# Altium footprint library ICs And Semiconductors SMD.PcbLib: 943 footprints (part 40 of 60)
Each footprint in its own frame and in the unit in brackets; x right, y up, seen from the top. Pads: shape width x height; smd on the part's side, far side on the other; paste and mask are expansions set on the pad; w line width, h text height; cw(c..) or ccw(c..) is an arc to the next point about the centre after c.
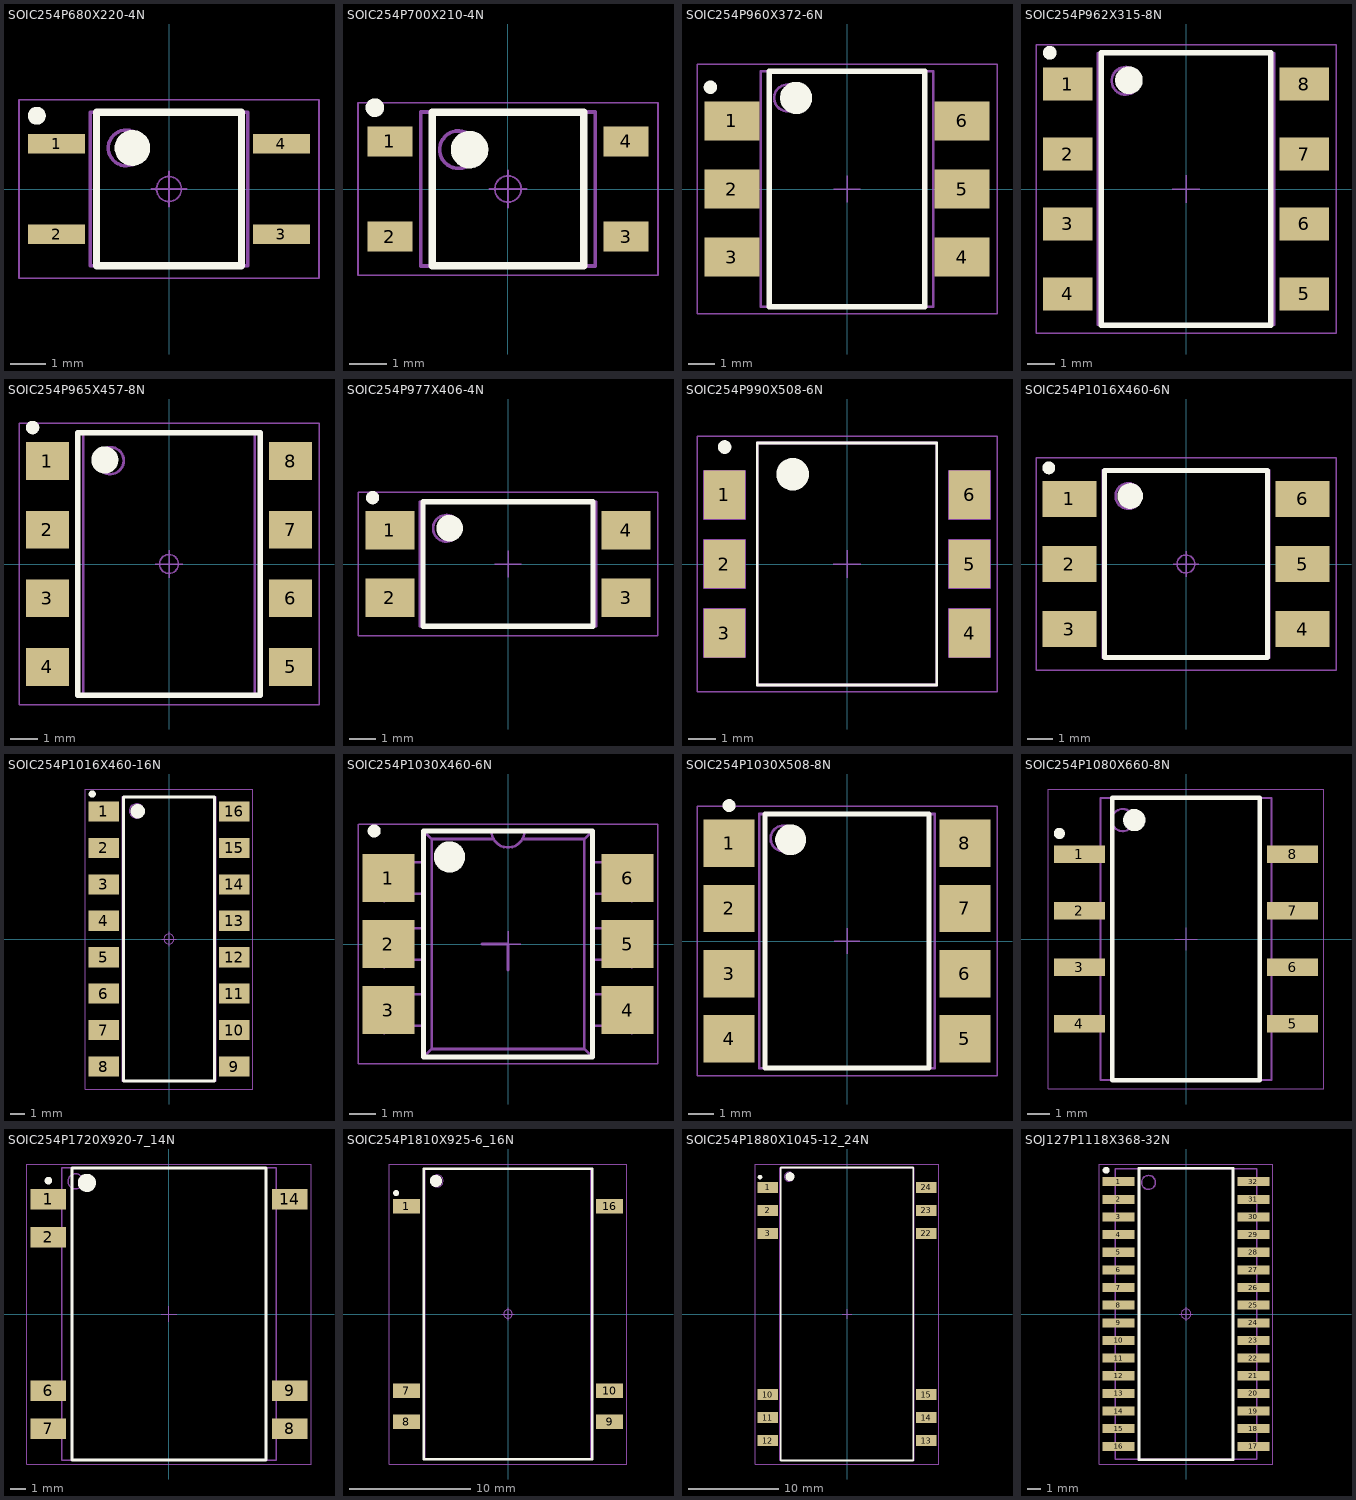
[diagram p39: the footprints below, top view; thin cyan lines are the x and y axes]

## SOIC254P680X220-4N [mm] "SOIC,2.54mm,pitch;4 pin,4.40mm W X 4.30mm L X 2.20mm H body, IPC Medium Density"
height 2.2
pads (4):
  rect 1.6x0.55 smd: 1(-3.15,1.27) 2(-3.15,-1.27) 3(3.15,-1.27) 4(3.15,1.27)
Top Overlay:
  circle w0.25: c-3.7,2.05 r0.125
  circle w0.5: c-1.025,1.15 r0.25
  lines w0.2: -2.025,-2.15 -2.025,2.15 2.025,2.15 2.025,-2.15 -2.025,-2.15
Mechanical 14:
  circle w0.1: c-1.2,1.15 r0.5
  lines w0.1: -2.2,-2.15 -2.2,2.15 2.2,2.15 2.2,-2.15 -2.2,-2.15
Mechanical 15:
  circle w0.05: c0,0 r0.35
  lines w0.05: -0.5,0 0.5,0 ; 0,-0.5 0,0.5 ; -4.2,-2.5 -4.2,2.5 4.2,2.5 4.2,-2.5 -4.2,-2.5
3D body "SOIC254P680X220-4N.stp": height 2.2, standoff 0, extent -3.6,-2.15 3.6,2.15

## SOIC254P700X210-4N [mm] "SOIC,2.54mm,pitch;4 pin,4.40mm W X 3.90mm L X 2.10mm H body, IPC Medium Density"
height 2.1
pads (4):
  rect 1.2x0.8 smd: 1(-3.15,1.27) 2(-3.15,-1.27) 3(3.15,-1.27) 4(3.15,1.27)
Top Overlay:
  circle w0.25: c-3.55,2.17 r0.125
  circle w0.5: c-1.025,1.05 r0.25
  lines w0.2: -2.025,-2.05 -2.025,2.05 2.025,2.05 2.025,-2.05 -2.025,-2.05
Mechanical 14:
  circle w0.1: c-1.325,1.05 r0.5
  lines w0.1: -2.325,-2.05 2.325,-2.05 2.325,2.05 -2.325,2.05 -2.325,-2.05
Mechanical 15:
  circle w0.05: c0,0 r0.35
  lines w0.05: -4,-2.3 -4,2.3 4,2.3 4,-2.3 -3.975,-2.3 ; -0.5,0 0.5,0 ; 0,-0.5 0,0.5
3D body "SOIC254P700X210-4N.stp": height 2.1, standoff 0, extent -3.7,-2.05 3.7,2.05

## SOIC254P960X372-6N [mm] "SOIC,2.54mm pitch;6 pin,6.44mm W X 8.80mm L, IPC Medium Density"
height 3.72
pads (6):
  rect 2.05x1.45 smd: 1(-4.3,2.54) 2(-4.3,0) 3(-4.3,-2.54) 4(4.3,-2.54) 5(4.3,0) 6(4.3,2.54)
Top Overlay:
  circle w0.6: c-1.9,3.4 r0.3
  circle w0.25: c-5.1,3.8 r0.125
  lines w0.2: -2.9,-4.4 -2.9,4.4 2.9,4.4 2.9,-4.4 -2.9,-4.4
Mechanical 14:
  circle w0.1: c-2.22,3.4 r0.5
  lines w0.1: -3.22,-4.4 -3.22,4.4 3.22,4.4 3.22,-4.4 -3.22,-4.4
Mechanical 15:
  lines w0.05: -0.5,0 0.5,0 ; 0,-0.5 0,0.5 ; -5.6,-4.65 -5.6,4.65 5.6,4.65 5.6,-4.65 -5.6,-4.65
3D body "SOIC254P960X372-6N.stp": height 3.6, standoff 0, extent -4.842,-4.425 4.842,4.425

## SOIC254P962X315-8N [mm] "DIP Gull Wing Surface Mount, 8-Leads, Body 9.86x6.4mm (nom), Pitch 2.54mm, IPC Medium Density"
height 3.15
pads (8):
  rect 1.8x1.2 smd: 1(-4.3,3.81) 2(-4.3,1.27) 3(-4.3,-1.27) 4(-4.3,-3.81) 5(4.3,-3.81) 6(4.3,-1.27) 7(4.3,1.27) 8(4.3,3.81)
Top Overlay:
  circle w0.25: c-4.95,4.95 r0.125
  circle w0.5: c-2.075,3.95 r0.25
  lines w0.2: -3.075,-4.95 -3.075,4.95 3.075,4.95 3.075,-4.95 -3.075,-4.95
Mechanical 14:
  circle w0.1: c-2.2,3.93 r0.5
  lines w0.1: -3.2,-4.93 3.2,-4.93 3.2,4.93 -3.2,4.93 -3.2,-4.93
Mechanical 15:
  lines w0.05: -0.5,0 0.5,0 ; 0,-0.5 0,0.5 ; -5.45,-5.25 5.45,-5.25 5.45,5.25 -5.45,5.25 -5.45,-5.25
3D body "SOIC254P962X315-8N.stp": height 2.95, standoff 0, extent -4.81,-4.94 4.81,4.97

## SOIC254P965X457-8N [mm] "DIP Gull Wing Surface Mount, 8-Leads, Body 9.65 x 6.35mm (nom), Pitch 2.54mm, IPC Medium Density"
height 4.57
pads (8):
  rect 1.6x1.4 smd: 1(-4.5,3.81) 2(-4.5,1.27) 3(-4.5,-1.27) 4(-4.5,-3.81) 5(4.5,-3.81) 6(4.5,-1.27) 7(4.5,1.27) 8(4.5,3.81)
Top Overlay:
  circle w0.5: c-2.375,3.85 r0.25
  circle w0.25: c-5.05,5.05 r0.125
  lines w0.2: -3.375,-4.85 3.375,-4.85 3.375,4.85 -3.375,4.85 -3.375,-4.85
Mechanical 14:
  circle w0.1: c-2.175,3.825 r0.5
  lines w0.1: -3.175,-4.825 3.175,-4.825 3.175,4.825 -3.175,4.825 -3.175,-4.825
Mechanical 15:
  circle w0.05: c0,0 r0.35
  lines w0.05: -0.5,0 0.5,0 ; 0,-0.5 0,0.5 ; -5.55,-5.2 5.55,-5.2 5.55,5.2 -5.55,5.2 -5.55,-5.2
3D body "SOIC254P965X457-8N.stp": height 4.57, standoff -0.02, extent -4.81,-4.94 4.81,4.97

## SOIC254P977X406-4N [mm] "SOIC, 2.54mm pitch; 4 pin, 6.65mm W X 4.69mm L, IPC Medium Density"
height 4.06
pads (4):
  rect 1.85x1.45 smd: 1(-4.45,1.27) 2(-4.45,-1.27) 3(4.45,-1.27) 4(4.45,1.27)
Top Overlay:
  circle w0.25: c-5.1,2.5 r0.125
  circle w0.5: c-2.2,1.35 r0.25
  lines w0.2: -3.2,-2.35 -3.2,2.35 3.2,2.35 3.2,-2.35 -3.2,-2.35
Mechanical 14:
  circle w0.1: c-2.322,1.345 r0.5
  lines w0.1: -3.322,-2.345 3.322,-2.345 3.322,2.345 -3.322,2.345 -3.322,-2.345
Mechanical 15:
  lines w0.05: -0.5,0 0.5,0 ; 0,-0.5 0,0.5 ; -5.65,-2.7 5.65,-2.7 5.65,2.7 -5.65,2.7 -5.65,-2.7
3D body "SOIC254P977X406-4N.stp": height 4.06, standoff 0, extent -5.015,-2.415 5.015,2.415

## SOIC254P990X508-6N [mm] "DIP Gull Wing Surface Mount, 6-Leads, Body 8.89x6.60mm (max), Pitch 2.54mm, IPC Medium Density"
height 5.08
pads (6):
  rect 1.52x1.78 smd: 1(-4.505,2.54) 2(-4.505,0) 3(-4.505,-2.54) 4(4.505,-2.54) 5(4.505,0) 6(4.505,2.54)
Top Overlay:
  circle w0.6: c-2,3.3 r0.3
  circle w0.25: c-4.5,4.3 r0.125
  lines w0.1: -3.3,-4.445 -3.3,4.445 3.3,4.445 3.3,-4.445 -3.3,-4.445
Mechanical 8:
  lines w0.05: -5.005,-2.54 -4.505,-2.54 ; -5.005,0 -4.505,0 ; -5.005,2.54 -4.505,2.54 ; -4.505,-3.04 -4.505,-2.54 ; -4.505,-2.04 -4.505,-2.54 ; -4.505,-0.5 -4.505,0 ; -4.505,0.5 -4.505,0 ; -4.505,2.04 -4.505,2.54 ; -4.505,3.04 -4.505,2.54 ; -4.005,-2.54 -4.505,-2.54 ; -4.005,0 -4.505,0 ; -4.005,2.54 -4.505,2.54 ; -0.5,0 0,0 ; 0,-0.5 0,0 ; 0,0.5 0,0 ; 0.5,0 0,0 ; 4.005,-2.54 4.505,-2.54 ; 4.005,0 4.505,0 ; 4.005,2.54 4.505,2.54 ; 4.505,-3.04 4.505,-2.54 ; 4.505,-2.04 4.505,-2.54 ; 4.505,-0.5 4.505,0 ; 4.505,0.5 4.505,0 ; 4.505,2.04 4.505,2.54 ; 4.505,3.04 4.505,2.54 ; 5.005,-2.54 4.505,-2.54 ; 5.005,0 4.505,0 ; 5.005,2.54 4.505,2.54 ; -5.265,-3.43 -3.745,-3.43 -3.745,-1.65 -5.265,-1.65 -5.265,-3.43 ; -5.265,-0.89 -3.745,-0.89 -3.745,0.89 -5.265,0.89 -5.265,-0.89 ; -5.265,1.65 -3.745,1.65 -3.745,3.43 -5.265,3.43 -5.265,1.65 ; 3.745,-3.43 5.265,-3.43 5.265,-1.65 3.745,-1.65 3.745,-3.43 ; 3.745,-0.89 5.265,-0.89 5.265,0.89 3.745,0.89 3.745,-0.89 ; 3.745,1.65 5.265,1.65 5.265,3.43 3.745,3.43 3.745,1.65
Mechanical 14:
  circle w0.1: c-2,3.3 r0.5
  lines w0.1: -3.3,-4.445 -3.3,4.445 3.3,4.445 3.3,-4.445 -3.3,-4.445
Mechanical 15:
  lines w0.05: -5.515,-4.695 5.515,-4.695 5.515,4.695 -5.515,4.695 -5.515,-4.695
3D body "SOIC254P990X508-6N.stp": height 5.08, standoff 0, extent -4.95,-4.445 4.95,4.445

## SOIC254P1016X460-6N [mm] "DIP Gull Wing Surface Mount, 6-Leads, Body 7.3x6.5mm, Pitch 2.54mm, IPC Medium Density"
height 4.6
pads (6):
  rect 2.1x1.4 smd: 1(-4.55,2.54) 2(-4.55,0) 3(-4.55,-2.54) 4(4.55,-2.54) 5(4.55,0) 6(4.55,2.54)
Top Overlay:
  circle w0.5: c-2.175,2.65 r0.25
  circle w0.25: c-5.35,3.75 r0.125
  lines w0.2: -3.175,-3.65 3.175,-3.65 3.175,3.65 -3.175,3.65 -3.175,-3.65
Mechanical 14:
  circle w0.1: c-2.25,2.65 r0.5
  lines w0.1: -3.25,-3.65 3.25,-3.65 3.25,3.65 -3.25,3.65 -3.25,-3.65
Mechanical 15:
  circle w0.05: c0,0 r0.35
  lines w0.05: -0.5,0 0.5,0 ; 0,-0.5 0,0.5 ; -5.85,-4.15 5.85,-4.15 5.85,4.15 -5.85,4.15 -5.85,-4.15
3D body "SOIC254P1016X460-6N.stp": height 4.6, standoff 0, extent -5.15,-3.9 5.15,3.9

## SOIC254P1016X460-16N [mm] "SOIC, 2.54mm Pitch; 16 Pin, 6.50mm W X 19.84mm L X 4.60mm H body, Pitch 2.54mm, IPC Medium Density"
height 4.6
pads (16):
  rect 2.1x1.4 smd: 1(-4.55,8.89) 2(-4.55,6.35) 3(-4.55,3.81) 4(-4.55,1.27) 5(-4.55,-1.27) 6(-4.55,-3.81) 7(-4.55,-6.35) 8(-4.55,-8.89) 9(4.55,-8.89) 10(4.55,-6.35) 11(4.55,-3.81) 12(4.55,-1.27) 13(4.55,1.27) 14(4.55,3.81) 15(4.55,6.35) 16(4.55,8.89)
Top Overlay:
  circle w0.5: c-2.175,8.9 r0.25
  circle w0.25: c-5.35,10.1 r0.125
  lines w0.2: -3.175,-9.9 3.175,-9.9 3.175,9.9 -3.175,9.9 -3.175,-9.9
Mechanical 14:
  circle w0.1: c-2.25,8.92 r0.5
  lines w0.1: -3.25,-9.92 3.25,-9.92 3.25,9.92 -3.25,9.92 -3.25,-9.92
Mechanical 15:
  circle w0.05: c0,0 r0.35
  lines w0.05: -0.5,0 0.5,0 ; 0,-0.5 0,0.5 ; -5.85,-10.45 5.85,-10.45 5.85,10.45 -5.85,10.45 -5.85,-10.45
3D body "SOIC254P1016X460-16N.stp": height 4.6, standoff 0, extent -5.15,-10.17 5.15,10.17

## SOIC254P1030X460-6N [mm] "DIP Gull Wing Surface Mount, 6-Leads, Body 8.7x6.5mm (max), Pitch 2.54mm, IPC Medium Density"
height 4.6
pads (6):
  rect 2x1.85 smd: 1(-4.6,2.54) 2(-4.6,0) 3(-4.6,-2.54) 4(4.6,-2.54) 5(4.6,0) 6(4.6,2.54)
Top Overlay:
  circle w0.25: c-5.15,4.35 r0.125
  circle w0.6: c-2.25,3.35 r0.3
  lines w0.2: -3.25,-4.35 3.25,-4.35 3.25,4.35 -3.25,4.35 -3.25,-4.35
Mechanical 8:
  lines w0.1: -5.525,-2.54 -4.763,-2.54 -4.763,-3.43 ; -5.525,0 -4.763,0 -4.763,-0.89 ; -5.525,2.54 -4.763,2.54 -4.763,1.65 ; -3.25,-4.35 -2.941,-4.041 ; -3.25,-3.15 -4,-3.15 -4.09,-2.815 -5.15,-2.815 -5.15,-2.265 -4.09,-2.265 -4,-1.93 -3.25,-1.93 ; -3.25,-0.61 -4,-0.61 -4.09,-0.275 -5.15,-0.275 -5.15,0.275 -4.09,0.275 -4,0.61 -3.25,0.61 ; -3.25,1.93 -4,1.93 -4.09,2.265 -5.15,2.265 -5.15,2.815 -4.09,2.815 -4,3.15 -3.25,3.15 ; -3.25,4.35 -2.941,4.041 ; -1,0 0,0 0,-1 ; -0.635,4.35 ccw(c0,4.35) 0.635,4.35 ; -0.554,4.041 -2.941,4.041 ; 0.554,4.041 2.941,4.041 ; 3.25,-4.35 2.941,-4.041 ; 3.25,-3.15 4,-3.15 4.09,-2.815 5.15,-2.815 5.15,-2.265 4.09,-2.265 4,-1.93 3.25,-1.93 ; 3.25,-0.61 4,-0.61 4.09,-0.275 5.15,-0.275 5.15,0.275 4.09,0.275 4,0.61 3.25,0.61 ; 3.25,1.93 4,1.93 4.09,2.265 5.15,2.265 5.15,2.815 4.09,2.815 4,3.15 3.25,3.15 ; 3.25,4.35 2.941,4.041 ; 4,-2.54 4.763,-2.54 4.763,-3.43 ; 4,0 4.763,0 4.763,-0.89 ; 4,2.54 4.763,2.54 4.763,1.65 ; -2.941,-4.041 2.941,-4.041 ; -2.941,-4.041 -2.941,4.041 ; 2.941,-4.041 2.941,4.041
Mechanical 14:
  circle w0.1: c-2.25,3.35 r0.5
  lines w0.1: -3.25,-4.35 3.25,-4.35 3.25,4.35 -3.25,4.35 -3.25,-4.35
Mechanical 15:
  lines w0.05: -5.773,4.6 -5.773,-4.6 5.773,-4.6 5.773,4.6 -5.75,4.6 ; -0.5,0 0.5,0 ; 0,-0.5 0,0.5
3D body "SOIC254P1030X460-6N.stp": height 4.6, standoff 0, extent -5.15,-4.35 5.15,4.35

## SOIC254P1030X508-8N [mm] "DIP Gull Wing Surface Mount, 8-Leads, Body 9.9x6.9mm (max), Pitch 2.54mm, IPC Medium Density"
height 5.08
pads (8):
  rect 2x1.85 smd: 1(-4.6,3.81) 2(-4.6,1.27) 3(-4.6,-1.27) 4(-4.6,-3.81) 5(4.6,-3.81) 6(4.6,-1.27) 7(4.6,1.27) 8(4.6,3.81)
Top Overlay:
  circle w0.6: c-2.2,3.95 r0.3
  circle w0.25: c-4.6,5.285 r0.125
  lines w0.2: -3.2,-4.95 3.2,-4.95 3.2,4.95 -3.2,4.95 -3.2,-4.95
Mechanical 14:
  circle w0.1: c-2.48,4.005 r0.5
  lines w0.1: -3.43,-4.955 3.43,-4.955 3.43,4.955 -3.43,4.955 -3.43,-4.955
Mechanical 15:
  lines w0.05: -0.5,0 0.5,0 ; 0,-0.5 0,0.5 ; -5.85,-5.25 5.85,-5.25 5.85,5.25 -5.85,5.25 -5.85,-5.25
3D body "SOIC254P1030X508-8N.stp": height 5.08, standoff 0, extent -5.15,-4.955 5.15,4.955

## SOIC254P1080X660-8N [mm] "SOIC, 2.54mm,pitch; 8 pin, 7.70mm W X 12.70mm L X 6.60mm H body, IPC Medium Density"
height 6.6
pads (8):
  rect 2.3x0.8 smd: 1(-4.8,3.81) 2(-4.8,1.27) 3(-4.8,-1.27) 4(-4.8,-3.81) 5(4.8,-3.81) 6(4.8,-1.27) 7(4.8,1.27) 8(4.8,3.81)
Top Overlay:
  circle w0.25: c-5.7,4.75 r0.125
  circle w0.5: c-2.325,5.35 r0.25
  lines w0.2: -3.325,-6.35 -3.325,6.35 3.325,6.35 3.325,-6.35 -3.325,-6.35
Mechanical 14:
  circle w0.1: c-2.85,5.35 r0.5
  lines w0.1: -3.85,-6.35 -3.85,6.35 3.85,6.35 3.85,-6.35 -3.85,-6.35
Mechanical 15:
  lines w0.05: -0.5,0 0.5,0 ; 0,-0.5 0,0.5 ; -6.2,-6.75 -6.2,6.75 6.2,6.75 6.2,-6.75 -6.2,-6.75
3D body "SOIC254P1080X660-8N.stp": height 6.6, standoff 0, extent -5.626,-6.475 5.626,6.475

## SOIC254P1720X920-7_14N [mm] "SOIC, 2.54mm pitch; 7 of 14 pin, 13.70mm W X 18.90mm L X 9.20mm H body, IPC Medium Density"
height 9.2
pads (7):
  rect 2.35x1.35 smd: 1(-8,7.62) 2(-8,5.08) 6(-8,-5.08) 7(-8,-7.62) 8(8,-7.62) 9(8,-5.08) 14(8,7.62)
Top Overlay:
  circle w0.25: c-8,8.845 r0.125
  circle w0.6: c-5.45,8.7 r0.3
  lines w0.2: -6.45,-9.7 -6.45,9.7 6.45,9.7 6.45,-9.7 -6.45,-9.7
Mechanical 14:
  circle w0.1: c-6.2,8.8 r0.5
  lines w0.1: -7.1,-9.7 -7.1,9.7 7.1,9.7 7.1,-9.7 -7.1,-9.7
Mechanical 15:
  lines w0.05: -0.5,0 0.5,0 ; 0,-0.5 0,0.5 ; -9.45,-9.95 -9.45,9.95 9.45,9.95 9.45,-9.95 -9.45,-9.95
3D body "DCDC_TRACO_TMR1SM.stp": height 9.45, standoff 0, extent -8.85,-9.7 8.85,9.7

## SOIC254P1810X925-6_16N [mm] "SOIC, 2.54mm, pitch; 6 pin, 13.70mm W X 24.00mm L X 9.25mm H body, IPC Medium Density"
height 9.25
pads (6):
  rect 2.25x1.2 smd: 1(-8.4,8.89) 7(-8.4,-6.35) 8(-8.4,-8.89) 9(8.4,-8.89) 10(8.4,-6.35) 16(8.4,8.89)
Top Overlay:
  circle w0.25: c-9.25,10 r0.125
  circle w0.5: c-5.95,11 r0.25
  lines w0.2: -6.95,-12 -6.95,12 6.95,12 6.95,-12 -6.95,-12
Mechanical 14:
  circle w0.1: c-5.85,11 r0.5
  lines w0.1: -6.85,-12 -6.85,12 6.85,12 6.85,-12 -6.85,-12
Mechanical 15:
  circle w0.05: c0,0 r0.35
  lines w0.05: -0.5,0 0.5,0 ; 0,-0.5 0,0.5 ; -9.8,-12.4 -9.8,12.4 9.8,12.4 9.8,-12.4 -9.8,-12.4
3D body "SOIC254P1810X925-6_16N.stp": height 10.45, standoff 0, extent -9.05,-12 9.05,12

## SOIC254P1880X1045-12_24N [mm] "SOIC, 2.54mm Pitch, 12 Pin of 24, 14.8 W X 32.3mm L X 10.45mm H, IPC Medium Density"
height 10.45
pads (12):
  rect 2.25x1.2 smd: 1(-8.75,13.97) 2(-8.75,11.43) 3(-8.75,8.89) 10(-8.75,-8.89) 11(-8.75,-11.43) 12(-8.75,-13.97) 13(8.75,-13.97) 14(8.75,-11.43) 15(8.75,-8.89) 22(8.75,8.89) 23(8.75,11.43) 24(8.75,13.97)
Top Overlay:
  circle w0.5: c-6.3,15.15 r0.25
  circle w0.25: c-9.6,15.1 r0.125
  lines w0.2: -7.3,-16.15 7.3,-16.15 7.3,16.15 -7.3,16.15 -7.3,-16.15
Mechanical 14:
  circle w0.1: c-6.4,15.15 r0.5
  lines w0.1: -7.4,-16.15 7.4,-16.15 7.4,16.15 -7.4,16.15 -7.4,-16.15
Mechanical 15:
  lines w0.05: -0.5,0 0.5,0 ; 0,-0.5 0,0.5 ; -10.15,-16.55 10.15,-16.55 10.15,16.55 -10.15,16.55 -10.15,-16.55
3D body "SOIC254P1880X1045-12_24N.stp": height 10.45, standoff 0, extent -9.4,-16.15 9.4,16.15

## SOJ127P1118X368-32N [mm] "SO J-Lead, 1.27mm, Pitch; 32 Pin, 10.16mm W X 20.95mm L X 3.68mm H body, IPC Medium Density"
height 3.68
pads (32):
  rect 2.3x0.65 smd: 1(-4.85,9.525) 2(-4.85,8.255) 3(-4.85,6.985) 4(-4.85,5.715) 5(-4.85,4.445) 6(-4.85,3.175) 7(-4.85,1.905) 8(-4.85,0.635) 9(-4.85,-0.635) 10(-4.85,-1.905) 11(-4.85,-3.175) 12(-4.85,-4.445) 13(-4.85,-5.715) 14(-4.85,-6.985) 15(-4.85,-8.255) 16(-4.85,-9.525) 17(4.85,-9.525) 18(4.85,-8.255) 19(4.85,-6.985) 20(4.85,-5.715) 21(4.85,-4.445) 22(4.85,-3.175) 23(4.85,-1.905) 24(4.85,-0.635) 25(4.85,0.635) 26(4.85,1.905) 27(4.85,3.175) 28(4.85,4.445) 29(4.85,5.715) 30(4.85,6.985) 31(4.85,8.255) 32(4.85,9.525)
Top Overlay:
  circle w0.25: c-5.75,10.35 r0.125
  lines w0.2: -3.375,-10.5 3.375,-10.5 3.375,10.5 -3.375,10.5 -3.375,-10.5
Mechanical 14:
  circle w0.1: c-2.7,9.475 r0.5
  lines w0.1: -5.08,-10.475 5.08,-10.475 5.08,10.475 -5.08,10.475 -5.08,-10.475
Mechanical 15:
  circle w0.05: c0,0 r0.35
  lines w0.05: -0.5,0 0.5,0 ; 0,-0.5 0,0.5 ; -6.25,-10.8 6.25,-10.8 6.25,10.8 -6.25,10.8 -6.25,-10.8
3D body "SOJ127P1118X368-32N.stp": height 3.68, standoff 0, extent -5.587,-10.54 5.588,10.54